# Altium footprint library Sensor.PcbLib: 18 footprints (part 2 of 2)
Each footprint in its own frame and in the unit in brackets; x right, y up, seen from the top. Pads: shape width x height; smd on the part's side, far side on the other; paste and mask are expansions set on the pad; w line width, h text height; cw(c..) or ccw(c..) is an arc to the next point about the centre after c.
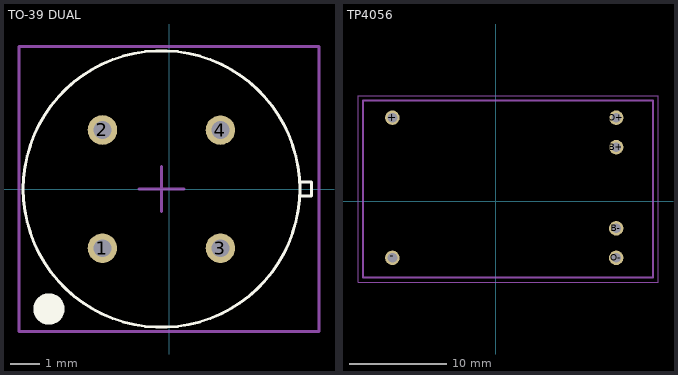
[diagram p1: the footprints below, top view; thin cyan lines are the x and y axes]

## TO-39 DUAL [mm] "GAS DETECTOR"
pads (4):
  round 1 hole 0.6 mask+0.102: 1(-2.255,-2.004) 2(-2.253,1.998) 3(1.743,-2.002) 4(1.742,1.995)
Top Overlay:
  circle w0.55: c-4.064,-4.064 r0.254
  circle w0.1: c-0.254,0 r4.684
  lines w0.1: 4.432,0.242 4.826,0.242 4.826,-0.237 4.434,-0.237
Mechanical 15:
  lines w0.1: -1.016,0 0.508,0 ; -0.254,-0.762 -0.254,0.762 ; -5.08,-4.826 -5.08,4.826 5.08,4.826 5.08,-4.826 -5.08,-4.826
3D body "USEQGCDAN82100.step": height 3.9, standoff -14.4, extent -4.849,-4.595 4.831,4.595

## TP4056 [mm]
pads (6):
  round 1.5 hole 1: +(-10.668,8.636) -(-10.668,-5.842) B+(12.446,5.588) B-(12.446,-2.794) O+(12.446,8.636) O-(12.446,-5.842)
Mechanical 3:
  lines w0.1: -14.224,10.16 -14.224,10.922 ; -14.224,10.922 -14.224,-8.382 16.764,-8.382 16.764,10.922 -14.224,10.922
  lines w0.2: -13.716,-7.874 -13.716,10.414 16.256,10.414 16.256,-7.874 -13.716,-7.874
3D body "BPSC-01.stp": height 6, standoff -5.54, extent 11.227,-4.166 13.767,-1.626
3D body "BPSC-01.stp": height 6, standoff -5.54, extent -11.913,7.366 -9.373,9.906
3D body "BPSC-01.stp": height 6, standoff -5.54, extent 11.1,-7.188 13.64,-4.648
3D body "BPSC-01.stp": height 6, standoff -5.54, extent 11.1,4.267 13.64,6.807
3D body "BPSC-01.stp": height 6, standoff -5.54, extent 11.125,7.29 13.665,9.83
3D body "TP4056_Charging_Module_Type_C.step": height 7.64, standoff 3.5, extent -13.38,-7.366 15.92,10.034
3D body "BPSC-01.stp": height 6, standoff -5.54, extent -11.913,-7.112 -9.373,-4.572